# Altium integrated library Mastermind Devices.IntLib: 910 symbols (part 5 of 6) (continued)
## STM32F429ZIT6U
designator U5, comment STM32F429ZIT6
STM32 Big Manta (STM32F429ZIT6U); Manuf_1: STM; Provided: ST; Ref St: 9175122; ECCN_US/EU: 3A991A2/NEC; Distrib: ST; Footprint: QFP144; Order: STM32F429ZIT6U; Manuf_Part_1: STM32F429ZIT6U
footprint TQFP144
part A pins: 1 PE2, 2 PE3, 3 PE4, 4 PE5, 5 PE6, 7 PC13-WKUP2, 8 PC14-OSC32_IN, 9 PC15-OSC32_OUT, 10 PF0, 11 PF1, 12 PF2, 13 PF3, 14 PF4, 15 PF5, 18 PF6, 19 PF7, 20 PF8, 21 PF9, 22 PF10, 23 PH0-OSC_IN, 24 PH1-OSC_OUT, 25 NRST, 26 PC0, 27 PC1, 28 PC2, 29 PC3, 34 PA0-WKUP1, 35 PA1, 36 PA2, 37 PA3, 40 PA4, 41 PA5, 42 PA6, 43 PA7, 44 PC4, 45 PC5, 46 PB0, 47 PB1, 48 PB2/BOOT1, 49 PF11, 50 PF12, 53 PF13, 54 PF14, 55 PF15, 56 PG0, 57 PG1, 58 PE7, 59 PE8, 60 PE9, 63 PE10, 64 PE11, 65 PE12, 66 PE13, 67 PE14, 68 PE15, 69 PB10, 70 PB11, 73 PB12, 74 PB13, 75 PB14, 76 PB15, 77 PD8, 78 PD9, 79 PD10, 80 PD11, 81 PD12, 82 PD13, 85 PD14, 86 PD15, 87 PG2, 88 PG3, 89 PG4, 90 PG5, 91 PG6, 92 PG7, 93 PG8, 96 PC6, 97 PC7, 98 PC8, 99 PC9, 100 PA8, 101 PA9, 102 PA10, 103 PA11, 104 PA12, 105 PA13, 109 PA14, 110 PA15, 111 PC10, 112 PC11, 113 PC12, 114 PD0, 115 PD1, 116 PD2, 117 PD3, 118 PD4, 119 PD5, 122 PD6, 123 PD7, 124 PG9, 125 PG10, 126 PG11, 127 PG12, 128 PG13, 129 PG14, 132 PG15, 133 PB3, 134 PB4, 135 PB5, 136 PB6, 137 PB7, 138 BOOT0, 139 PB8, 140 PB9, 141 PE0, 142 PE1
part B pins: 6 VBAT, 16 VSS_5, 17 VDD_5, 30 VDD_12, 31 VSSA, 32 VREF+, 33 VDDA, 38 VSS_4, 39 VDD_4, 51 VSS_6, 52 VDD_6, 61 VSS_7, 62 VDD_7, 71 VCAP1, 72 VDD_1, 83 VSS_8, 84 VDD_8, 94 VSS_9, 95 VDD_9, 106 VCAP2, 107 VSS_2, 108 VDD_2, 120 VSS_10, 121 VDD_10, 130 VSS_11, 131 VDD_11, 143 PDR_ON, 144 VDD_3

## STM32G030F6P6
designator U?
Manufacturer: ST(意法半导体); Contributor: LCSC; Supplier: LCSC; Supplier Part: C724040; Manufacturer Part: STM32G030F6P6; JLCPCB Part Class: Extended Part; spicePre: U; spiceSymbolName: STM32G030F6P6
footprint TSSOP-20_L6.5-W4.4-P0.65-LS6.4-BL
pins: 1 PB7/PB8, 2 PB9/PC14-OSC32_IN, 3 PC15-OSC32_OUT, 4 VDD/VDDA, 5 VSS/VSSA, 6 NRST, 7 PA0, 8 PA1, 9 PA2, 10 PA3, 11 PA4, 12 PA5, 13 PA6, 14 PA7, 15 PB0/PB1/PB2/PA8, 16 PA11[PA9], 17 PA12[PA10], 18 PA13, 19 PA15/PA14-BOOT0, 20 PB3/PB4/PB5/PB6

## STM32L031G6U6
designator U?
Manufacturer: ST(意法半导体); Add into BOM: yes; CPU Core: ARM Cortex-M Series; Program Storage Size: 32KB; Program Memory Type: FLASH; Symbol: STM32L031G6U6; Device: STM32L031G6U6; LCSC Part Name: 超低功耗Arm Cortex-M0+ MCU，具有32-KB Flash存储器和32 MHz CPU; Supplier Part: C96514; Manufacturer Part: STM32L031G6U6; Supplier Footprint: UFQFPN-28(4x4); JLCPCB Part Class: Extended Part; Datasheet: https://item.szlcsc.com/datasheet/STM32L031G6U6/97719.html; Supplier: LCSC; Convert to PCB: yes; Applications: -
footprint UFQFPN-28_L4.0-W4.0-P0.50-BL
3D model UFQFPN-28_L4.0-W4.0-H0.6-P0.50
pins: 1 VDD, 2 PC14/OSC32_IN, 3 PC15/OSC32_OUT, 4 NRST, 5 VDDA, 6 PA0-CK_IN, 7 PA1, 8 PA2, 9 PA3, 10 PA4, 11 PA5, 12 PA6, 13 PA7, 14 PB0, 15 PB1, 16 VSS, 17 VDD, 18 PA8, 19 PA9, 20 PA10, 21 PA13, 22 PA14, 23 PA15, 24 PB3, 25 PB6, 26 PB7, 27 BOOT0, 28 VSS

## STM32L412K8T6
designator U?, comment MCU_LQFP32/QFN32
footprint LQFP32 (Footprint not found)
footprint ST_LQFP_32_V (LQFP32 Recommended ,32 Pin MCU Size,7x7mm, Pitch, 0.8mm)
footprint LQFP32_0R5_7x7 (LQFP32 Recommended ,32 Pin MCU Size,7x7mm, Pitch, 0.8mm)
pins: 1 VDD3, 2 PF0/PC14, 3 PF1/PC15, 4 NRST, 5 VDDA/VREF+, 6 PA0, 7 PA1, 8 PA2, 9 PA3, 10 PA4, 11 PA5, 12 PA6, 13 PA7, 14 PB0, 15 PB1/NPOR, 16 PB2/VSS2, 17 VDD2/VDD_USB, 18 PA8, 19 PA9, 20 PA10, 21 PA11, 22 PA12, 23 PA13, 24 PA14, 25 PA15, 26 PB3, 27 PB4, 28 PB5, 29 PB6, 30 PB7, 31 BOOT0/PB8/PH3, 32 PB8/VSS3

## STM32L432KBU6
designator *
footprint STM32L432KBU6
pins: 1 VDD, 2 PC14_OSC32_IN, 3 PC15_OSC32_OUT, 4 NRST, 5 VDDA/VREF+, 6 PA0/CK_IN, 7 PA1, 8 PA2, 9 PA3, 10 PA4, 11 PA5, 12 PA6, 13 PA7, 14 PB0, 15 PB1, 16 VSS, 17 VDD, 18 PA8, 19 PA9, 20 PA10, 21 PA11, 22 PA12, 23 PA13, 24 PA14, 25 PA15, 26 PB3, 27 PB4, 28 PB5, 29 PB6, 30 PB7, 31 PH3/BOOT0, 32 VSS, 33 EP

## STM-USB_DVI_HDMIULC6-4SC6X-SOT23-6L
designator D2, comment USBLC6-2SC6
Very low capacitance ESD protection, 3.5 pF, -40 to 125 degC, 6-Pin SOT23, RoHS, Tape and Reel; Manufacturer: STMicroelectronics; Polarity: Uni-Directional; Clamping Voltage: 17V; Rad Hardened: No; Product Height (mm): 1.3mm; Leakage Current (Max): 0.15uA; Product Length (mm): 3.05mm; Number of Elements: 1; Peak Pulse Current: 5A; Configuration: Dual; Reverse Breakdown Voltage: 6V; Working Voltage (Max): 5V; Capacitance Value: 3.5pF; Suppressor Type: DiodeArrays; Product Depth (mm): 1.75mm; Test Current (It): 1mA; Package / Case: SOT-23; Operating Temperature Max Deg. C: 125C; Package Description: 6-Pin Small Outline Transistor, Body 2.925 x 1.625 mm, Pitch 0.95 mm; Package Reference: SOT23-6L; Datasheet Version: Rev. 5, 10/2011; Operating Temperature Min Deg. C: -40C; Mounting Style: SurfaceMount; Direction Type: Uni-Directional; Mounting: SurfaceMount; Pin Count: 6; Leakage Current: 0.15uA; Packaging: TapeandReel; Operating Temperature Classification: Automotive; Clamping Voltage (Max): 17V; Manufacturer URL: http://www.st.com/; Reverse Stand-off Voltage: 5V; Datasheet URL: http://www.st.com/st-web-ui/static/active/en/resource/technical/document/datasheet/CD00050750.pdf; Working Voltage: 5V; Operating Temp Range: -40Cto125C
footprint STM-SOT23-6L_V (SOT23, 6-Leads, Body 3.05x1.75mm, Pitch 0.95mm)
pins: 1 I/O 1, 2 GND, 3 I/O 2, 4 I/O 3, 5 VBUS, 6 I/O 4

## SUNLOGO
designator ?, comment Just a SMT logo of a sun. cute!  (value not drawn)
footprint SUN

## SUPERCAP
designator C?
footprint 414-VA5R
pins: +, -

## SW B3FS
designator S?, comment DTSM-61-NR
SPNA SMD Keyboard Switch
3D model SPNA (PCB3D Model)
footprint B3FS_SWITCH
footprint KEY-TH_4P-L6.2-W6.2-P4.50-LS6.5
pins: 1, 2, 3, 4

## SW Button
designator SW?, comment TS-1088-AR02016  (value not drawn)
TACTILE SWITCH Button
footprint SMD_3×4×2.0
pins: P$1, P$2

## SW DIP-2
designator S?
DIP Switch, 2 Position, SPST; Published: 24-Mar-1999; LatestRevisionDate: 17-Jul-2002; LatestRevisionNote: Re-released for DXP Platform.; PackageReference: DIP-4; Publisher: Altium Limited
simulation model dpsw2 (Spice Subcircuit)
footprint SW_1571983-1
pins: 1 A1, 2 A2, 3 B2, 4 B1

## SW DSTM 61 NR
designator Button, comment Button
SWITCH TACTILE SPST-NO 0.05A 24V; Manufacturer: TE Connectivity Alcoswitch; Manufacturer Part Number: 1825910-6; Actuator Material: PBT; Mechanical Life: 100000Cycles; Operating Force: 160gf; Throw Configuration: SPST; Illumination Type: Non-Illuminated,Illuminated; Switch Travel: 0.25mm; Switch Function: Off-Mom; Contact Current Rating: 50mA; Actuator Type: Standard; Contact Resistance: 100mR; Actuator Length: 0.055inch; RoHS: Yes; Category: Pushbutton Switches; Stock 1: 97530; Pricing 1: 1=0,10000, 10=0,10100, 25=0,09560, 100=0,08700, 250=0,08180, 500=0,07484, 1000=0,06265, 2500=0,06092, 5000=0,05743 (USD); Mount: Through Hole; Contact Material: Copper Alloy; Contact Plating: Silver; Min Operating Temperature: -35°C; Max Operating Temperature: 85°C; Termination: PC Pins; Package Quantity: 750; Packaging: Loose Piece; Orientation: Straight; Max Voltage Rating (DC): 24V; Electrical Life: 100000Cycles; Max Current Rating: 50mA; Type: Switch; Length: 5.99mm; REACH SVHC: Unknown; ELV: Compliant; Lead Free: Lead Free; ComponentLink1URL: https://datasheet.ciiva.com/30199/1825910-6rqpn1825910-6-30199520.pdf?src-supplier=Onlinecomponents.com; ComponentLink1Description: https://datasheet.ciiva.com/30199/1825910-6rqpn1825910-6-30199520.pdf?src-supplier=Onlinecomponents.com; ComponentLink2URL: https://datasheet.ciiva.com/15184/getdatasheetpartid-395915-15184509.pdf?src-supplier=Verical; ComponentLink2Description: https://datasheet.ciiva.com/15184/getdatasheetpartid-395915-15184509.pdf?src-supplier=Verical; Supplier 1: Digi-Key; Supplier Part Number 1: 450-1650-ND
footprint 1825910-6_BUTTON
pins: 1, 2, 3, 4

## SW DTS-24N-S-V
designator SW?, comment DTS-24N-S-V
SPST 12V Plugin-4P,12x12mm Tactile Switches ROHS; Manufacturer: 圜达; Add into BOM: yes; Actuator Style: Rectangle button; Switch Length: 12mm; Switch Height: 7.3mm; Contact Current: 50mA; Symbol: DTS-24N-S-V; Device: DTS-24N-S-V; LCSC Part Name: 插件 160gf 行程0.35mm; Supplier Part: C225016; Manufacturer Part: DTS-24N-S-V; Supplier Footprint: 插件-4P,12x12mm; JLCPCB Part Class: Extended Part; Datasheet: https://atta.szlcsc.com/upload/public/pdf/source/20180517/C225016_A66C7DCE5B55F6D373EC2A1FE36CD0FB.pdf; Supplier: LCSC; Convert to PCB: yes; Circuit: SPST; Mounting Style: -; Switch Width: 12mm; Voltage Rating (DC): 12V; With Lamp: -; Mechanical Life: -
footprint KEY-TH_4P-L12.0-W12.0-P5.00-LS12.5
footprint KEY-TH_4P-L12.0-W12.0-P5.00-LS13.4-EH
pins: 1, 2, 3, 4

## SW-DPDT
designator SW?, comment Switch
SMD slide Switch (ON-ON); Part Number: Switch-Slide-DPDT-8.5x3.6mm; Manufacturer: Dailywell; Manufacturer Part Number: SS206VM-G2-LLR-R; 2nd source part number: 401-2002-1-ND; Artikkelnr Noca: 50019107; Artikkelnr Simpro: N.A.; Datasheet: \\hizz\pro\app9717\Datasheet\switches\Daliywell\SS206VM-G2-LLR-R.pdf; Footprint Doc: Switch-Slide-DPDT-8.5x3.6mm; LatestRevisionDate: 2016-04-21; Pin Count: 6; Publisher: Nordic Semiconductor; Published: 2014-06-24; Value: Switch; Note: *; Supplier: Cabcon; Supplier part number: SS206VM-G2-LLR-R; 2nd source Supplier: Digi-Key
footprint Switch-Slide-DPDT-8.5x3.6mm
pins: 1 N.O-1, 2 COM-1, 3 N.C-1, 4 N.O-2, 5 COM-2, 6 N.C-2

## SW-DPST
designator S?
Double-Pole, Single-Throw Switch; Published: 24-Mar-1999; LatestRevisionDate: 17-Jul-2002; LatestRevisionNote: Re-released for DXP Platform.; PackageReference: DPST-4; Publisher: Altium Limited; PackageDescription: Switch; 4 Leads
footprint DPST-4 (Switch; 4 Leads)
pins: 1 COMMON1, 2 NO1, 3 COMMON2, 4 NO2

## SW-MSK12D18G2 125
designator SW?, comment MSK12D18G2 125
100mA SPDT 12V, P=2.5mm Slide Switches ROHS; Manufacturer: SHOU HAN(首韩); Add into BOM: yes; Actuator Style: Rectangular columnar; Switch Length: 9.1mm; Switch Width: 3.5mm; Mechanical Life: 1万次; Symbol: MSK12D18G2 125; Device: MSK12D18G2 125; LCSC Part Name: 两档侧拨 单边3脚插件 柄长2.0mm; Supplier Part: C19192981; Manufacturer Part: MSK12D18G2 125; Supplier Footprint: 插件,P=2.5mm; JLCPCB Part Class: Extended Part; Datasheet: https://atta.szlcsc.com/upload/public/pdf/source/20231116/4DEFB07ADFD9D2AC5A25C39A09190EB4.pdf; Supplier: LCSC; Convert to PCB: yes; Circuit: SPDT; Pin Style: -; Switch Height: -; Mounting Style: -; Actuator Color: -; Current Rating (DC): 100mA; Voltage Rating (DC): 12V; Current Rating (AC): -; Voltage Rating (AC): -; Operating Temperature: -25℃~+70℃
footprint SW-TH_MSK12D18G2
3D model SW-TH_MSK12D18G2
pins: 1, 2, 3

## SW-PB
designator SW?, comment PB SW
Tactile Switch, SPNO, SMD, 160gf, 6.2x6.3x2.5mm; Part Number: Switch-PB-6.2x6.3mm-SMD; Manufacturer: Dailywell; Manufacturer Part Number: TS604VM1-025BR-R; 2nd source part number: 688-SKHUALE010; Artikkelnr Noca: 50019106; Artikkelnr Simpro: N.A.; Datasheet: \\hizz\pro\app9717\Datasheet\switches\Daliywell\TS604VM1-025BR-R.pdf; Footprint Doc: Switch-PB-6.2x6.3mm-SMD; LatestRevisionDate: 2016-04-21; Pin Count: 4; Publisher: Nordic Semiconductor; Published: 2010-02-01; Value: PB SW; Note: *; Supplier: Cabcon; Supplier part number: TS604VM1-025BR-R; 2nd source Supplier: Mouser
footprint Switch-PB-6.2x6.3mm-SMD
pins: 1 N.O, 2 COM

## SW-PB-22E60-N
designator SW?, comment PB-22E60-N
Plugin Pushbutton Switches ROHS; Manufacturer: DEALON(德艺隆); Add into BOM: yes; Symbol: PB-22E60-N; Device: PB-22E60-N; LCSC Part Name: 按键开关 5.8x5.8插件无锁开关; Supplier Part: C2998783; Manufacturer Part: PB-22E60-N; Supplier Footprint: 插件; JLCPCB Part Class: Extended Part; Datasheet: https://atta.szlcsc.com/upload/public/pdf/source/20220507/79962BB3DA664513C0382644120F17B8.pdf; Supplier: LCSC; Convert to PCB: yes
footprint SW-TH_6P-L5.8-W5.8-P2.00-LS4.5-BL
pins: 1 NC, 2 COM, 3 NO, 4 NC, 5 COM, 6 NO

## SWITCH Button
designator SW?, comment TS-1088-AR02016  (value not drawn)
TACTILE SWITCH Button
footprint SMD_3×4×2.0
pins: P$1, P$2

## SWITCH_PUSHBUTTON_90
designator SW?
footprint BTN_90deg
pins: P$1, P$2

## SWITCH_PUSHBUTTONC&K_KSS_1
designator SW?, comment ButtonsSOFTTOUCHSMD_SJ - Soft touch temporary push button (Super Junk Akihabara)    Compatible with SKPMANE010 [Mouser: 688-SKPMAN]   C&K_KSS = Digikey: KSS221GLFS
footprint BTN_CK_KSS
pins: P$1, P$2

## SWITCH_PUSHBUTTONEVQ-PE
designator SW?, comment ButtonsSOFTTOUCHSMD_SJ - Soft touch temporary push button (Super Junk Akihabara)    Compatible with SKPMANE010 [Mouser: 688-SKPMAN]   C&K_KSS = Digikey: KSS221GLFS
footprint TACT_PANA-EVQ
pins: P$1, P$2

## SWITCH_PUSHBUTTONSOFTTOUCHSMD_SJ
designator SW?, comment ButtonsSOFTTOUCHSMD_SJ - Soft touch temporary push button (Super Junk Akihabara)    Compatible with SKPMANE010 [Mouser: 688-SKPMAN]   C&K_KSS = Digikey: KSS221GLFS
footprint PUSHBUTTON_SMD_SJ
pins: P$1, P$2

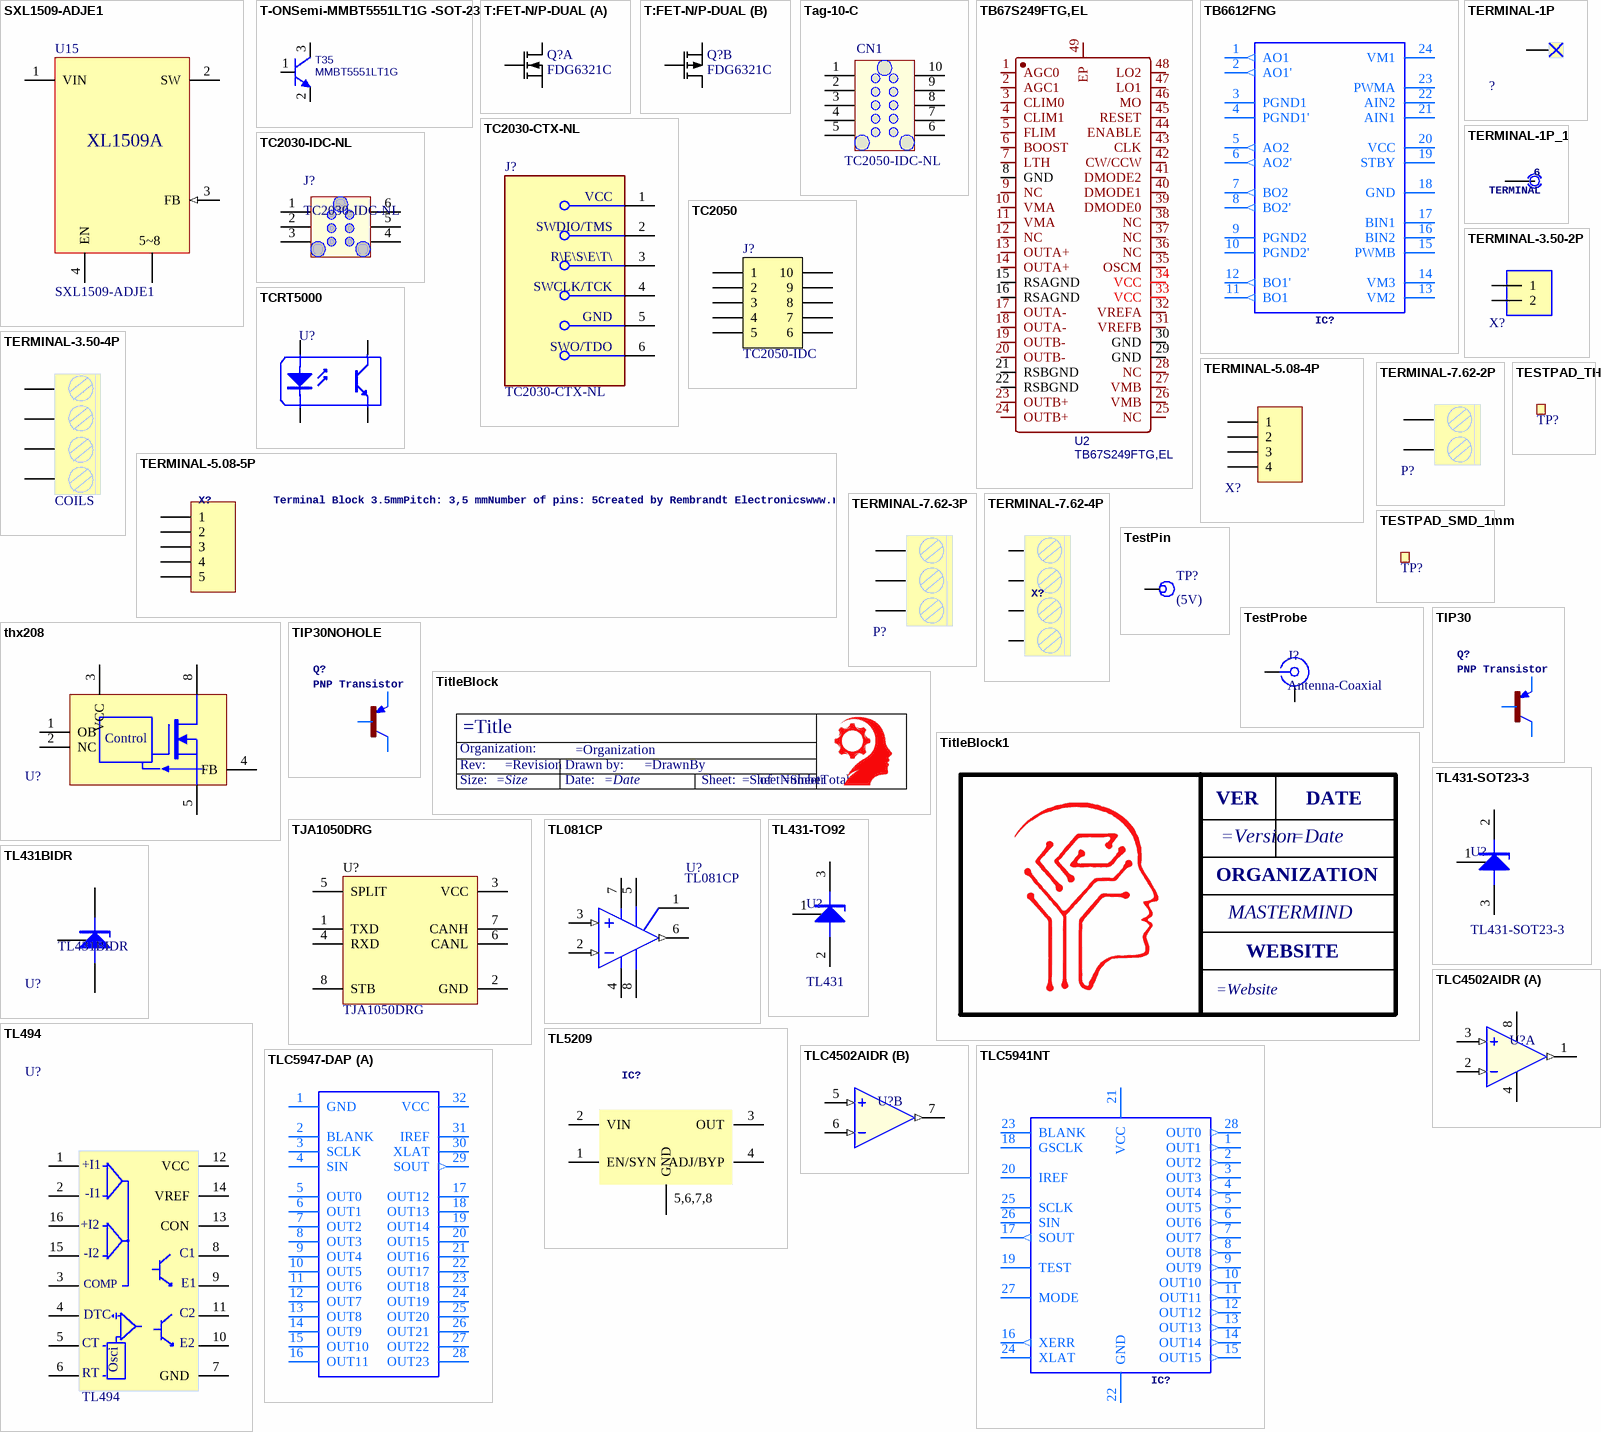
[diagram p34: symbols SXL1509-ADJE1 to TLC5947-DAP]

## SXL1509-ADJE1
designator U15
Manufacturer: JSMSEMI(杰盛微); Add into BOM: yes; Function: Step-down type; Input Voltage: 4.5V~40V; Output Current: 3A; Switching Frequency: 150kHz; Number of Outputs: 1; Topology: Step-down; Switch tube (built-in/external): Built-in; Symbol: SXL1509-ADJE1; Device: SXL1509-ADJE1; LCSC Part Name: SXL1509-ADJE1; Supplier Part: C33960109; Manufacturer Part: SXL1509-ADJE1; Supplier Footprint: SOP-8; JLCPCB Part Class: Extended Part; Datasheet: https://atta.szlcsc.com/upload/public/pdf/source/20240726/0E098D5FB7F2843E33EFD320F31891AB.pdf; Supplier: LCSC; Convert to PCB: yes; Output Type: -; Output Voltage: -; Operating Temperature: -40℃~+125℃; Quiescent Current (Iq): -
3D model SOIC-8_L4.9-W3.9-H1.7-LS6.0-P1.27
footprint SOIC-8_L4.9-W3.9-P1.27-LS6.0-BL
pins: 1 VIN, 2 SW, 3 FB (in), 4 EN, 5 GND
text: XL1509A; 5~8

## T-ONSemi-MMBT5551LT1G -SOT-23
designator T35, comment MMBT5551LT1G
Bipolar Transistor NPN 160V 600mA  225mW Surface Mount SOT-23-3; Manufacturer Name: ONSemi; Manufacturer Part No.: MMBT5551LT1G
footprint ONSC-SOT-23-3-318-08_V (SOT23, 3-Leads, Body 2.92x1.3mm, Pitch 0.95mm)
pins: 1 B, 2 E, 3 C

## T:FET-N/P-DUAL
designator Q?, comment FDG6321C
Fairchild, FDG6321C, Dual N & P Channel Digital FET; Part Number: FDG6321C_IPC; 2nd source part number: FDG6321CCT-ND; Artikkelnr Noca: 35029089; Artikkelnr Simpro: N.A.; Manufacturer: Fairchild; Manufacturer Part Number: FDG6321C; Datasheet: http://www.fairchildsemi.com/ds/FD/FDG6321C.pdf; LatestRevisionDate: 2011-07-04; Pin Count: 6; Publisher: Nordic Semiconductor; Published: 2012-07-04; Value: FDG6321C; Note: Dual N & P Channel Digital FET; Supplier: Farnell; Supplier part number: 170-0689; 2nd source Supplier: Digi-Key; Footprint Doc: SC70-6
footprint SOT65P210X100-6N
part A pins: 1 S1, 2 G1, 6 D1
part B pins: 3 D2, 4 S2, 5 G2

## Tag-10-C
designator CN1  value TC2050-IDC-NL  (hidden comment: Tag-10-C)
Tag_Connector Header, 10x2, No legs; Internal_Part_Number: MCD-00031; Manufacturer_Part_Number: TC2050-IDC-NL-FP; Manufacturer: TAG-CONNECT LLC; Provided_By: Subcon; Initial_Board_Reference: MB1274; Status: Released; Part_Type: Connector; ComponentLink1Description: TAG_Connector_TC2050-IDC-NLFP.pdf; ComponentLink1URL: http://tunmcdsvn.tun.st.com/Component_Datasheet_Library/Trunk/Connectors/TAG_Connector_TC2050-IDC-NLFP; ECCN_US: n/a; ECCN_EU: n/a
footprint CON_TAG-C_TC2050-IDC-NL
footprint CON_TAG-C_TC2050-IDC-NL
pins: 1, 2, 3, 4, 5, 6, 7, 8, 9, 10

## TB67S249FTG,EL
designator U2
BOM_Manufacturer: TOSHIBA(东芝); Contributor: LCSC; BOM_Supplier: LCSC; BOM_Supplier Part: C2150608; BOM_Manufacturer Part: TB67S249FTG,EL; BOM_JLCPCB Part Class: Extended Part; spicePre: U; spiceSymbolName: TB67S249FTG,EL
footprint QFN-48_L7.0-W7.0-P0.50-BL-EP5.4
pins: 1 AGC0, 2 AGC1, 3 CLIM0, 4 CLIM1, 5 FLIM, 6 BOOST, 7 LTH, 8 GND, 9 NC, 10 VMA, 11 VMA, 12 NC, 13 OUTA+, 14 OUTA+, 15 RSAGND, 16 RSAGND, 17 OUTA-, 18 OUTA-, 19 OUTB-, 20 OUTB-, 21 RSBGND, 22 RSBGND, 23 OUTB+, 24 OUTB+, 25 NC, 26 VMB, 27 VMB, 28 NC, 29 GND, 30 GND, 31 VREFB, 32 VREFA, 33 VCC, 34 VCC, 35 OSCM, 36 NC, 37 NC, 38 NC, 39 DMODE0, 40 DMODE1, 41 DMODE2, 42 CW/CCW, 43 CLK, 44 ENABLE, 45 RESET, 46 MO, 47 LO1, 48 LO2, 49 EP

## TB6612FNG
designator IC?, comment TB6612FNG   MOS dual H-bridge motor driver, 1.2A current 3.2A peak 3 or 5v logic and 3-15v motor  (value not drawn)
footprint SSOP24
pins: 1 AO1 (out), 2 AO1' (out), 3 PGND1 (power), 4 PGND1' (power), 5 AO2 (out), 6 AO2' (out), 7 BO2 (out), 8 BO2' (out), 9 PGND2 (power), 10 PGND2' (power), 11 BO1 (out), 12 BO1' (out), 13 VM2 (power), 14 VM3 (power), 15 PWMB, 16 BIN2, 17 BIN1, 18 GND (power), 19 STBY, 20 VCC (power), 21 AIN1, 22 AIN2, 23 PWMA, 24 VM1 (power)

## TC2030-CTX-NL
designator J?
6-Pin “No legs” TC2030 Plug-of-Nails™ Cable for use with ARM Cortex processors
footprint FP-TC2030-CTX-NL-MFG
footprint TC2030MCPNL10
pins: 1 VCC, 2 SWDIO/TMS, 3 ~{RESET}, 4 SWCLK/TCK, 5 GND, 6 SWO/TDO

## TC2030-IDC-NL
designator J?
CABLE ADAPTER 6 POS; Value: *; MP: TC2030-IDC-NL; Availability: Unavailable; Package: None; Price: None
footprint TAG_TC2030-IDC-NL
pins: 1, 2, 3, 4, 5, 6

## TC2050
designator J?, comment TC2050-IDC  (no BOM)
CBL PLUG-OF-NAILS 10-PIN; Part Number: TC2050-IDC-NLFP; Manufacturer: Tag-Connect LLC; Artikkelnr Noca: N.A.; Manufacturer Part Number: TC2050-IDC-NLFP; Datasheet: http://www.tag-connect.com/Materials/TC2050-IDC%20Datasheet.pdf; LatestRevisionDate: 2012-11-21; Publisher: Nordic Semiconductor; Published: 2012-11-21; Value: TC2050-IDC; Supplier: Digi-Key; Supplier part number: TC2050-IDC-NL-ND; 2nd source Supplier: *; 2nd source part number: *; Pin Count: 10; Footprint Doc: TC2050-IDC-NLFP; Artikkelnr Simpro: N.A.
footprint TC2050-IDC-NLFP
pins: 1, 2, 3, 4, 5, 6, 7, 8, 9, 10

## TCRT5000
designator U?  (value not drawn)
IR Transiver Pair; Published: 24-Mar-1999; LatestRevisionDate: 04-Mar-2005; LatestRevisionNote: Sch pins 3 & 4 Swapped.; DatasheetVersion: Nov-2003; PackageReference: DIP-4; Publisher: Altium Limited
footprint OPTO_TCRT5000
pins: 1 A "Anode", 2 K "Cathode", 3 E "Emitter", 4 C "Collector"

## TERMINAL-1P
designator ?
footprint TERMINAL
pins: CON 1

## TERMINAL-1P_1
designator 6, comment TERMINAL
footprint PAD_1P
pins: 1

## TERMINAL-3.50-2P
designator X?, comment Terminal Block 3.5mmPitch: 3,5 mmNumber of pins: 2Created by Rembrandt Electronicswww.rembrandtelectronics.com  (value not drawn)
SymbolName_1: TERMINAL-BLOCK-PIN-3.5MM; GateName_1: -1
footprint TERMINAL-BLOCK-2-PIN-3.5MM-ROUND-PAD
pins: 1, 2

## TERMINAL-3.50-4P
designator COILS, comment Terminal Block 3.5mmPitch: 3,5 mmNumber of pins: 2Created by Rembrandt Electronicswww.rembrandtelectronics.com  (value not drawn)
SymbolName_1: TERMINAL-BLOCK-PIN-3.5MM; GateName_1: -1
footprint TERMINAL-BLOCK-4-PIN-3.5MM-ROUND-PAD
pins: 1 K, 2 A, 3 K, 4 A

## TERMINAL-5.08-4P
designator X?
GateName_1: -1; SymbolName_1: TERMINAL-BLOCK-PIN-3.5MM
footprint TERMINAL-BLOCK-4-PIN-5MM-ROUND-PAD
pins: 1, 2, 3, 4

## TERMINAL-5.08-5P
designator X?, comment Terminal Block 3.5mmPitch: 3,5 mmNumber of pins: 5Created by Rembrandt Electronicswww.rembrandtelectronics.com
GateName_1: -1; SymbolName_1: TERMINAL-BLOCK-PIN-3.5MM
footprint TERMINAL-BLOCK-5-PIN-3.5MM-ROUND-PAD - duplicate
pins: 1, 2, 3, 4, 5

## TERMINAL-7.62-2P
designator P?, comment Terminal Block 3.5mmPitch: 3,5 mmNumber of pins: 2Created by Rembrandt Electronicswww.rembrandtelectronics.com  (value not drawn)
GateName_1: -1; SymbolName_1: TERMINAL-BLOCK-PIN-3.5MM
footprint CONN-TH_KF7.62-2P
footprint CONN-TH_KF9.50-2P
pins: 1 K, 2 A

## TERMINAL-7.62-3P
designator P?, comment Terminal Block 3.5mmPitch: 3,5 mmNumber of pins: 2Created by Rembrandt Electronicswww.rembrandtelectronics.com  (value not drawn)
GateName_1: -1; SymbolName_1: TERMINAL-BLOCK-PIN-3.5MM
footprint CONN-TH_KF7.62-3P
pins: 1 K, 2 A, 3 A

## TERMINAL-7.62-4P
designator X?, comment Terminal Block 3.5mmPitch: 3,5 mmNumber of pins: 2Created by Rembrandt Electronicswww.rembrandtelectronics.com  (value not drawn)
GateName_1: -1; SymbolName_1: TERMINAL-BLOCK-PIN-3.5MM
footprint TERMINAL-BLOCK-4-PIN-7.6MM-LONG-PAD
pins: 1 K, 2 A, 3 A, 4 A

## TESTPAD_SMD_1mm
designator TP?, comment Ø1.0mm,SMD  (value not drawn)  (no BOM)
Part Number: TP_SMD_Ø1.0MM; Manufacturer: Nordic Semiconductor; Artikkelnr Noca: N.A.; Manufacturer Part Number: *; Datasheet: *; LatestRevisionDate: 2013-06-11; Pin Count: 1; Publisher: Nordic Semiconductor; Published: 2013-06-11; Value: Ø1.0mm,SMD; Note: *; Supplier: *; Supplier part number: *; 2nd source Supplier: *; 2nd source part number: *; Footprint Doc: TP_SMD_Ø1.0mm; Artikkelnr Simpro: N.A.
footprint Test Pin 1.3mm
pins: 1

## TESTPAD_TH
designator TP?, comment TP  (value not drawn)  (no BOM)
Testpoint, through hole; Part Number: Testpoint TH; Artikkelnr Noca: N.A.; Manufacturer: *; Manufacturer Part Number: *; Datasheet: *; Footprint Doc: TESTPAD-TH; LatestRevisionDate: 2009-12-12; Pin Count: 1; Publisher: Nordic Semiconductor; Published: 2009-12-12; Value: TP; Note: *; Supplier: *; Supplier part number: *; 2nd source Supplier: *; 2nd source part number: *; Artikkelnr Simpro: N.A.
footprint TESTPAD-TH
footprint TP_TH_1MM_YELLOW
footprint TP_TH_1MM_RED
footprint TP_TH_1MM_GREEN
footprint TP_TH_1MM_BLUE
footprint TP_TH_1MM_BLACK
pins: 1

## TestPin
designator TP?, comment (5V)  (no BOM)
footprint Test Pin
footprint Test Pin Hole
footprint TP_TH_1MM_YELLOW
footprint TP_TH_1MM_RED
footprint TP_TH_1MM_GREEN
footprint TP_TH_1MM_BLUE
footprint TP_TH_1MM_BLACK
pins: 1 TP

## TestProbe
designator J?, comment Antenna-Coaxial
Ossciloscope test probe
pins: 1 Signal, 2 GND/SHIELD

## thx208
designator U?
footprint SOIC-8E_thx208 (SOIC, 8-Leads, Body 4.90x3.90mm, Pitch 1.27mm, IPC Medium Density)
pins: 1 OB (power), 2 NC, 3 VCC, 4 FB (power), 5 GND, 8 OC
text: Control

## TIP30
designator Q?, comment PNP Transistor
footprint TO220
pins: 1 B, 2 C, 3 E

## TIP30NOHOLE
designator Q?, comment PNP Transistor
footprint TO220-NOHOLE
pins: 1 B, 2 C, 3 E

## TitleBlock
designator *  (value not drawn)  (graphical)
Title Block for Schematic Sheets
text: Organization:; Rev:; Drawn by:; Size:; Date:; Sheet:; of

## TitleBlock1
designator *  (value not drawn)  (graphical)
Title Block for Schematic Sheets
text: VER; DATE; ORGANIZATION; MASTERMIND; WEBSITE

## TJA1050DRG
designator U?
1Mbps 4.75V~5.25V 70mA CAN Transceiver SOP-8 CAN Transceivers ROHS; Manufacturer: HGC(深圳汉芯); Add into BOM: yes; Symbol: TJA1050DRG; Device: TJA1050DRG; LCSC Part Name: TJA1050DRG; Supplier Part: C19723770; Manufacturer Part: TJA1050DRG; Supplier Footprint: SOP-8; JLCPCB Part Class: Extended Part; Datasheet: https://atta.szlcsc.com/upload/public/pdf/source/20231229/9EC40A6172CAB0350BF7AF3421F4DEBF.pdf; Supplier: LCSC; Convert to PCB: yes
footprint SOIC-8E (SOIC, 8-Leads, Body 4.90x3.90mm, Pitch 1.27mm, IPC Medium Density)
footprint SOIC-8_L4.9-W3.9-P1.27-LS6.0-BL
pins: 1 TXD, 2 GND, 3 VCC, 4 RXD, 5 SPLIT, 6 CANL, 7 CANH, 8 STB

## TL081CP
designator U?
3mV 3MHz 30pA DIP-8 FET Input Amplifiers ROHS; Manufacturer: TI(德州仪器); Add into BOM: yes; Slew Rate(SR): 13V/us; Supply Current Per Channel: 1.4mA; Symbol: TL081CP; Device: TL081CP; LCSC Part Name: JFET 输入运算放大器; Supplier Part: C38969; Manufacturer Part: TL081CP; Supplier Footprint: DIP-8; JLCPCB Part Class: Extended Part; Datasheet: https://www.ti.com/cn/lit/gpn/tl082a; Supplier: LCSC; Convert to PCB: yes; Gain Bandwidth Product(GBP): 3MHz; Current - Input Bias(Ib): 30pA; Voltage - Input Offset(Vos): 3mV; Operating Temperature: 0℃~+70℃
footprint SOIC-8_L4.9-W3.9-P1.27-LS6.0-BL
pins: 1 OS NULL, 2 IN- (in), 3 IN+ (in), 4 V-, 5 OS NULL, 6 OUT (out), 7 V+, 8 NC

## TL431-SOT23-3
designator U?
Shunt Voltage Regulator
footprint SOT23
pins: 1 Ref "REFERENCE", 2 K "CATHODE", 3 A "ANODE"

## TL431-TO92
designator U?, comment TL431
Shunt Voltage Regulator
footprint TO92-INLINE
pins: 1 Ref "REFERENCE", 2 A "ANODE", 3 K "CATHODE"

## TL431BIDR
designator U?
TL431 Precision Programmable Reference; Manufacturer: TI(德州仪器); Add into BOM: yes; Output Type: Adjustable; Output Voltage: 2.495V~36V; Output Current: 100mA; Tolerance: ±0.5%; Reference Type: parallel connection; Minimum Cathode Current for Regulation: 700uA; Symbol: TL431BIDR; Device: TL431BIDR; LCSC Part Name: TL431BIDR; Supplier Part: C366884; Manufacturer Part: TL431BIDR; Supplier Footprint: SOIC-8; JLCPCB Part Class: Extended Part; Datasheet: https://www.ti.com/cn/lit/gpn/tl431; Supplier: LCSC; Convert to PCB: yes; Input Voltage: -; Temperature Coefficient: -; Supply Current: -; Noise - 1/10Hz to 10Hz: -; Noise - 10Hz to 10kHz: -; Operating Temperature: -40℃~+85℃@(Ta)
footprint SOIC-8E (SOIC, 8-Leads, Body 4.90x3.90mm, Pitch 1.27mm, IPC Medium Density); pin to pad 3>2+3+6+7
footprint SOIC-8_L4.9-W3.9-P1.27-LS6.0-BL
pins: 1 K "CATHODE", 3 A "ANODE", 4 NC hidden, 5 NC hidden, 8 Ref "REFERENCE"

## TL494
designator U?  (value not drawn)
TL494 IC
footprint SO-16
footprint Model Name (Model Description)
footprint DIP-16_L19.8-W6.5-P2.54-LS7.6-BL
pins: 1 +IN1, 2 -IN1, 3 FB, 4 DTC, 5 CT, 6 RT, 7 GND, 8 C1, 9 E1, 10 E2, 11 C2, 12 VCC, 13 CON, 14 VREF, 15 -IN2, 16 +IN2
text: +I1; -I1; +I2; -I2; COMP; Osci

## TL5209
designator IC?
footprint SOIC-8E (SOIC, 8-Leads, Body 4.90x3.90mm, Pitch 1.27mm, IPC Medium Density)
pins: 1 EN/SYN, 2 VIN, 3 OUT, 4 ADJ/BYP, 5 GND, 6 GND, 7 GND (power), 8 GND (power)
text: 5,6,7,8

## TLC4502AIDR
designator U?, comment LM358  (value not drawn)
4.7MHz 1pA Dual channel SOIC-8 Precision Op Amps ROHS
footprint SOIC-8E (SOIC, 8-Leads, Body 4.90x3.90mm, Pitch 1.27mm, IPC Medium Density)
footprint DIL08-ROUND
part A pins: 1 OA (out), 2 A- (in), 3 A+ (in), 4 GND, 8 VCC
part B pins: 5 B+ (in), 6 B- (in), 7 OB (out)

## TLC5941NT
designator IC?
footprint DIL28-3
pins: 1 OUT1 (out), 2 OUT2 (out), 3 OUT3 (out), 4 OUT4 (out), 5 OUT5 (out), 6 OUT6 (out), 7 OUT7 (out), 8 OUT8 (out), 9 OUT9 (out), 10 OUT10 (out), 11 OUT11 (out), 12 OUT12 (out), 13 OUT13 (out), 14 OUT14 (out), 15 OUT15 (out), 16 XERR (out), 17 SOUT (out), 18 GSCLK, 19 TEST, 20 IREF, 21 VCC (power), 22 GND (power), 23 BLANK, 24 XLAT, 25 SCLK, 26 SIN, 27 MODE, 28 OUT0 (out)